# Altium footprint library Vowstar_MCU.PcbLib: 56 footprints (part 4 of 4)
Each footprint in its own frame and in the unit in brackets; x right, y up, seen from the top. Pads: shape width x height; smd on the part's side, far side on the other; paste and mask are expansions set on the pad; w line width, h text height; cw(c..) or ccw(c..) is an arc to the next point about the centre after c.
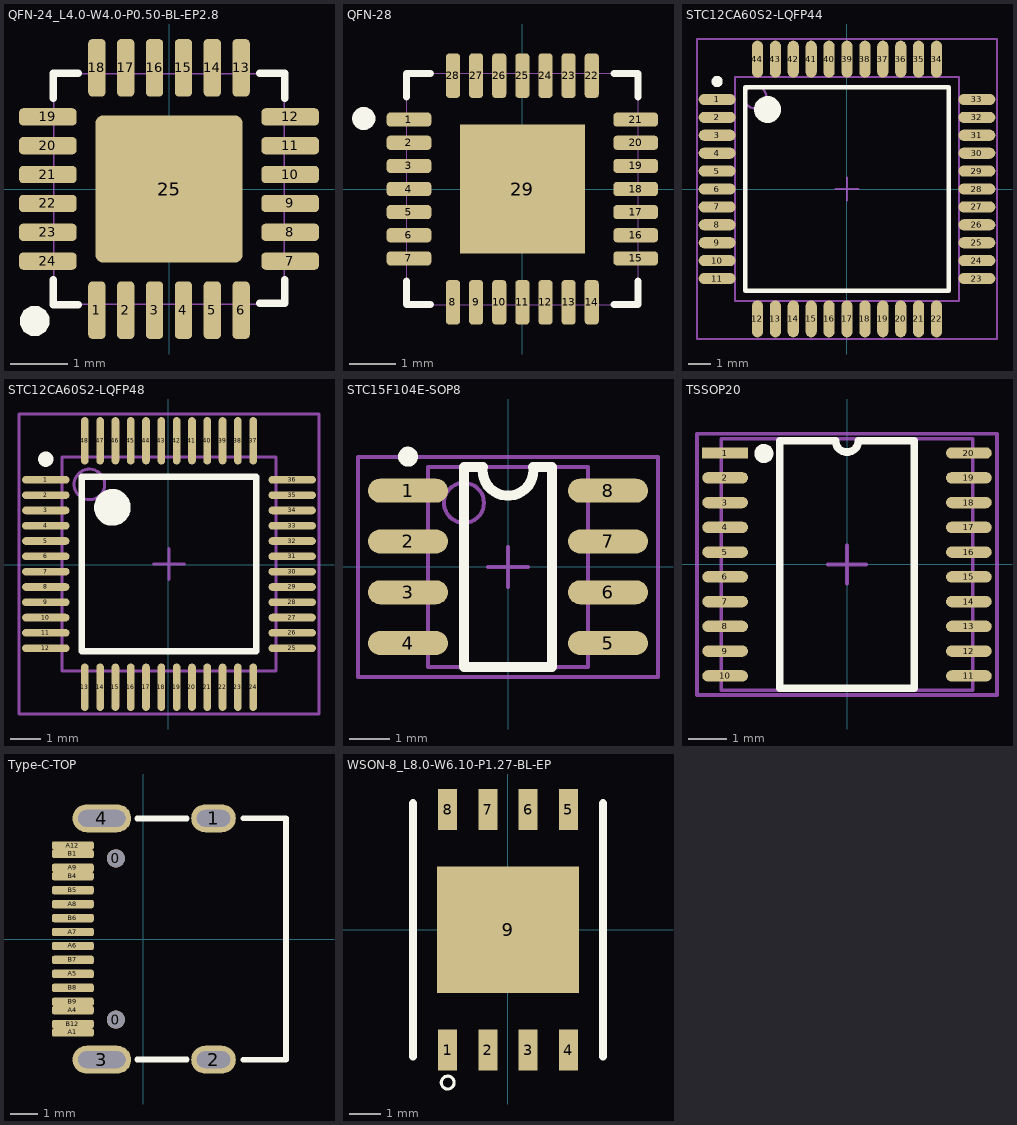
[diagram p3: the footprints below, top view; thin cyan lines are the x and y axes]

## QFN-24_L4.0-W4.0-P0.50-BL-EP2.8 [mm]
pads (25):
  rrect50% 0.3x1 smd: 1(-1.25,-2.1) 2(-0.75,-2.1) 3(-0.25,-2.1) 4(0.25,-2.1) 5(0.75,-2.1) 6(1.25,-2.1) 13(1.25,2.1) 14(0.75,2.1) 15(0.25,2.1) 16(-0.25,2.1) 17(-0.75,2.1) 18(-1.25,2.1)
  rrect50% 1x0.3 smd: 7(2.1,-1.25) 8(2.1,-0.75) 9(2.1,-0.25) 10(2.1,0.25) 11(2.1,0.75) 12(2.1,1.25) 19(-2.1,1.25) 20(-2.1,0.75) 21(-2.1,0.25) 22(-2.1,-0.25) 23(-2.1,-0.75) 24(-2.1,-1.25)
  rrect10% 2.55x2.55 smd: 25(0,0)
Top Overlay:
  region: -2.074,-2.286 -2.074,-2.218 -2.142,-2.1 -2.26,-2.033 -2.396,-2.033 -2.514,-2.101 -2.582,-2.219 -2.582,-2.355 -2.514,-2.473 -2.396,-2.541 -2.26,-2.541 -2.142,-2.474 -2.074,-2.356 -2.074,-2.288
  lines w0.127: -2.007,-1.575 -2.007,-2.007 -1.575,-2.007 ; -2.007,1.575 -2.007,2.007 -1.575,2.007 ; 1.575,-1.981 2.007,-1.981 2.007,-1.575 ; 1.575,2.007 2.007,2.007 2.007,1.575
Mechanical 13:
  lines w0.025: -2,-2 -2,2 2,2 2,-2 -2,-2
3D body "User Library-QFN 24 4x4.step": height 0.9, standoff 0, extent -2.002,-2.002 2.002,2.002

## QFN-28 [mil]
height 31.5
pads (29):
  rrect50% 38x12 smd mask+5: 1(-96.5,59.06) 2(-96.5,39.37) 3(-96.5,19.68) 4(-96.5,0) 5(-96.5,-19.68) 6(-96.5,-39.37) 7(-96.5,-59.06) 15(96.5,-59.06) 16(96.5,-39.37) 17(96.5,-19.68) 18(96.5,0) 19(96.5,19.68) 20(96.5,39.37) 21(96.5,59.06)
  rrect50% 12x38 smd mask+5: 8(-59.06,-96.5) 9(-39.37,-96.5) 10(-19.68,-96.5) 11(0,-96.5) 12(19.68,-96.5) 13(39.37,-96.5) 14(59.06,-96.5) 22(59.06,96.5) 23(39.37,96.5) 24(19.68,96.5) 25(0,96.5) 26(-19.68,96.5) 27(-39.37,96.5) 28(-59.06,96.5)
  rect 106.3x110.24 smd: 29(0,0)
Top Overlay:
  circle w9.84: c-135,60 r4.92
  lines w6: -98.5,-78.16 -98.5,-98.5 -78.16,-98.5 ; -98.5,78.16 -98.5,98.5 -78.16,98.5 ; 78.16,-98.5 98.5,-98.5 98.5,-78.16 ; 78.16,98.5 98.5,98.5 98.5,78.16
Mechanical 1:
  lines w0: -98.5,-98.5 98.5,-98.5 98.5,98.5 -98.5,98.5 -98.5,-98.5 ; -98.5,-65.06 -98.5,-53.06 -98.5,-65.06 ; -98.5,-45.37 -98.5,-33.37 -98.5,-45.37 ; -98.5,-25.68 -98.5,-13.69 -98.5,-25.68 ; -98.5,-6 -98.5,6 -98.5,-6 ; -98.5,13.69 -98.5,25.68 -98.5,13.69 ; -98.5,33.37 -98.5,45.37 -98.5,33.37 ; -98.5,53.06 -98.5,65.06 -98.5,53.06 ; -65.06,-98.5 -53.06,-98.5 -65.06,-98.5 ; -65.06,98.5 -53.06,98.5 -65.06,98.5 ; -45.37,-98.5 -33.37,-98.5 -45.37,-98.5 ; -45.37,98.5 -33.37,98.5 -45.37,98.5 ; -25.68,-98.5 -13.69,-98.5 -25.68,-98.5 ; -25.68,98.5 -13.69,98.5 -25.68,98.5 ; -6,-98.5 6,-98.5 -6,-98.5 ; -6,98.5 6,98.5 -6,98.5 ; 13.69,-98.5 25.68,-98.5 13.69,-98.5 ; 13.69,98.5 25.68,98.5 13.69,98.5 ; 33.37,-98.5 45.37,-98.5 33.37,-98.5 ; 33.37,98.5 45.37,98.5 33.37,98.5 ; 53.06,-98.5 65.06,-98.5 53.06,-98.5 ; 53.06,98.5 65.06,98.5 53.06,98.5 ; 98.5,-65.06 98.5,-53.06 98.5,-65.06 ; 98.5,-45.37 98.5,-33.37 98.5,-45.37 ; 98.5,-25.68 98.5,-13.69 98.5,-25.68 ; 98.5,-6 98.5,6 98.5,-6 ; 98.5,13.69 98.5,25.68 98.5,13.69 ; 98.5,33.37 98.5,45.37 98.5,33.37 ; 98.5,53.06 98.5,65.06 98.5,53.06
3D body "321.stp": height 35.43, standoff 0, extent -98.5,-98.5 98.35,98.35

## STC12CA60S2-LQFP44 [mm] "STC12CA60S2-LQFP44"
height 2.1
pads (44):
  oval 1.65x0.5 smd: 1(-5.8,4) 2(-5.8,3.2) 3(-5.8,2.4) 4(-5.8,1.6) 5(-5.8,0.8) 6(-5.8,0) 7(-5.8,-0.8) 8(-5.8,-1.6) 9(-5.8,-2.4) 10(-5.8,-3.2) 11(-5.8,-4) 23(5.8,-4) 24(5.8,-3.2) 25(5.8,-2.4) 26(5.8,-1.6) 27(5.8,-0.8) 28(5.8,0) 29(5.8,0.8) 30(5.8,1.6) 31(5.8,2.4) 32(5.8,3.2) 33(5.8,4)
  oval 0.5x1.65 smd: 12(-4,-5.8) 13(-3.2,-5.8) 14(-2.4,-5.8) 15(-1.6,-5.8) 16(-0.8,-5.8) 17(0,-5.8) 18(0.8,-5.8) 19(1.6,-5.8) 20(2.4,-5.8) 21(3.2,-5.8) 22(4,-5.8) 34(4,5.8) 35(3.2,5.8) 36(2.4,5.8) 37(1.6,5.8) 38(0.8,5.8) 39(0,5.8) 40(-0.8,5.8) 41(-1.6,5.8) 42(-2.4,5.8) 43(-3.2,5.8) 44(-4,5.8)
Top Overlay:
  circle w0.6: c-3.55,3.55 r0.3
  circle w0.25: c-5.8,4.8 r0.125
  lines w0.2: -4.55,-4.55 4.55,-4.55 4.55,4.55 -4.55,4.55 -4.55,-4.55
Mechanical 13:
  circle w0.1: c-4.1,4.1 r0.5
  lines w0.1: -5,-5 5,-5 5,5 -5,5 -5,-5
Mechanical 15:
  lines w0.1: -0.5,0 0.5,0 ; 0,-0.5 0,0.5 ; -6.7,-6.7 6.7,-6.7 6.7,6.7 -6.7,6.7 -6.7,-6.7
3D body "User Library-QFP-44.step": height 1.6, standoff 0, extent -6.02,-6.01 6.001,6.01

## STC12CA60S2-LQFP48 [mm] "STC12CA60S2"
height 1
pads (48):
  oval 1.55x0.25 smd: 1(-4.008,2.771) 2(-4.008,2.271) 3(-4.008,1.771) 4(-4.008,1.271) 5(-4.008,0.771) 6(-4.008,0.271) 7(-4.008,-0.229) 8(-4.008,-0.729) 9(-4.008,-1.229) 10(-4.008,-1.729) 11(-4.008,-2.229) 12(-4.008,-2.729) 25(4.042,-2.729) 26(4.042,-2.229) 27(4.042,-1.729) 28(4.042,-1.229) 29(4.042,-0.729) 30(4.042,-0.229) 31(4.042,0.271) 32(4.042,0.771) 33(4.042,1.271) 34(4.042,1.771) 35(4.042,2.271) 36(4.042,2.771)
  oval 0.25x1.55 smd: 13(-2.733,-4.004) 14(-2.233,-4.004) 15(-1.733,-4.004) 16(-1.233,-4.004) 17(-0.733,-4.004) 18(-0.233,-4.004) 19(0.267,-4.004) 20(0.767,-4.004) 21(1.267,-4.004) 22(1.767,-4.004) 23(2.267,-4.004) 24(2.767,-4.004) 37(2.767,4.046) 38(2.267,4.046) 39(1.767,4.046) 40(1.267,4.046) 41(0.767,4.046) 42(0.267,4.046) 43(-0.233,4.046) 44(-0.733,4.046) 45(-1.233,4.046) 46(-1.733,4.046) 47(-2.233,4.046) 48(-2.733,4.046)
Top Overlay:
  circle w0.6: c-1.833,1.871 r0.3
  circle w0.25: c-4.008,3.446 r0.125
  lines w0.2: -2.833,-2.829 2.867,-2.829 2.867,2.871 -2.833,2.871 -2.833,-2.829
Mechanical 13:
  circle w0.1: c-2.583,2.621 r0.5
  lines w0.1: -3.483,-3.479 3.517,-3.479 3.517,3.521 -3.483,3.521 -3.483,-3.479
Mechanical 15:
  lines w0.1: -0.483,0.021 0.517,0.021 ; 0.017,-0.479 0.017,0.521 ; -4.883,-4.879 4.917,-4.879 4.917,4.921 -4.883,4.921 -4.883,-4.879
3D body "User Library-QFP-48.step": height 1.35, standoff 0, extent -4.445,-4.514 4.583,4.514

## STC15F104E-SOP8 [mm] "STC15F104E-SOP8"
height 1.5
pads (8):
  oval 2x0.6 smd: 1(-2.5,1.905) 2(-2.5,0.635) 3(-2.5,-0.635) 4(-2.5,-1.905) 5(2.5,-1.905) 6(2.5,-0.635) 7(2.5,0.635) 8(2.5,1.905)
Top Overlay:
  circle w0.25: c-2.5,2.755 r0.125
  lines w0.254: -1.1,-2.5 1.1,-2.5 ; -1.1,-2.489 -1.1,2.5 -0.626,2.5 ; -0.635,2.413 ccw(c0,2.413) 0.635,2.413 ; 0.626,2.5 1.1,2.5 1.1,-2.489
Mechanical 13:
  circle w0.1: c-1.1,1.6 r0.5
  lines w0.1: -2,-2.5 -2,2.5 2,2.5 2,-2.5 -2,-2.5
Mechanical 15:
  lines w0.1: -0.5,0 0.5,0 ; 0,-0.5 0,0.5 ; -3.75,-2.75 -3.75,2.75 3.75,2.75 3.75,-2.75 -3.75,-2.75
3D body "User Library-SOP-8.step": height 1.45, standoff 0, extent -2.921,-2.451 2.857,2.451

## TSSOP20 [mm] "SSOP; 20 Leads; Body Width 3.9 mm; Pitch 0.64 mm"
height 1.75
pads (20):
  rect 1.2x0.3 smd: 1(-3.2,2.925)
  oval 1.2x0.3 smd: 2(-3.2,2.275) 3(-3.2,1.625) 4(-3.2,0.975) 5(-3.2,0.325) 6(-3.2,-0.325) 7(-3.2,-0.975) 8(-3.2,-1.625) 9(-3.2,-2.275) 10(-3.2,-2.925) 11(3.2,-2.925) 12(3.2,-2.275) 13(3.2,-1.625) 14(3.2,-0.975) 15(3.2,-0.325) 16(3.2,0.325) 17(3.2,0.975) 18(3.2,1.625) 19(3.2,2.275) 20(3.2,2.925)
Top Overlay:
  circle w0.25: c-2.182,2.912 r0.125
  lines w0.2: -1.765,-3.25 1.765,-3.25 1.765,3.25 0.3,3.25 cw(c0,3.25) -0.3,3.25 -1.765,3.25 -1.765,-3.25
Mechanical 13:
  lines w0.1: -3.302,-3.302 -3.302,3.302 3.302,3.302 3.302,-3.302 -3.302,-3.302
Mechanical 15:
  lines w0.1: -0.5,0 0.5,0 ; 0,-0.5 0,0.5 ; -3.937,-3.429 -3.937,3.429 3.937,3.429 3.937,-3.429 -3.937,-3.429
3D body "User Library-TSSOP-20-1.step": height 1.2, standoff 0, extent -3.277,-3.3 3.273,3.3

## Type-C-TOP [mm]
height 0.8
pads (22):
  round 0.65 hole 0.65: 0(-0.98,-2.89) 0(-0.98,2.89)
  oval 1.6x1 hole 0.6 slot 1.2 at 0 deg: 1(2.52,4.325) 2(2.52,-4.325)
  oval 2.1x1 hole 0.6 slot 1.7 at 0 deg: 3(-1.48,-4.325) 4(-1.48,4.325)
  rrect50% 1.5x0.3 smd: A1(-2.52,-3.35) A4(-2.52,-2.55) A5(-2.52,-1.25) A6(-2.52,-0.25) A7(-2.52,0.25) A8(-2.52,1.25) A9(-2.52,2.55) A12(-2.52,3.35) B1(-2.52,3.05) B4(-2.52,2.25) B5(-2.52,1.75) B6(-2.52,0.75) B7(-2.52,-0.75) B8(-2.52,-1.75) B9(-2.52,-2.25) B12(-2.52,-3.05)
Top Overlay:
  lines w0.203: -0.218,-4.318 1.56,-4.318 ; -0.218,4.318 1.56,4.318 ; 3.592,-4.325 5.12,-4.325 5.12,4.325 3.592,4.325
3D body "User Library-1054500101.STEP": height 3.28, standoff -0.68, extent -2.645,-4.476 5.255,4.464

## WSON-8_L8.0-W6.10-P1.27-BL-EP [mm]
pads (9):
  rect 0.6x1.3 smd: 1(-1.905,-3.8) 2(-0.635,-3.8) 3(0.635,-3.8) 4(1.905,-3.8) 5(1.905,3.8) 6(0.635,3.8) 7(-0.635,3.8) 8(-1.905,3.8)
  rect 4.5x4 smd: 9(0,0)
Top Overlay:
  circle w0.1: c-1.905,-4.826 r0.203
  lines w0.254: -3,-4 -3,4 ; 3,-4 3,4
3D body "User Library-WSON-8_6x8mm.STEP": height 0.81, standoff -0.07, extent -3,-4.039 3,3.961